# Altium schematic symbol library jlcpcb_2025_04_resistors_extended_1210.schlib: 2670 symbols (part 9 of 14) (continued)
## FRC1210F1201TS
designator R?  Resistance: 1.2kΩ  (hidden comment: *)
Resistor, 1.2kΩ, ±1%, 333.333mW, 200V, ±100ppm/℃, SMD 1210; Manufacturer: Uniroyal; Manufacturer Part Number: FRC1210F1201TS; Supplier 1: LCSC; Supplier Part Number 1: C3000653; JLCPCB Part Number: C3000653; Power Rating: 333.333mW; Category: Resistors; Package Size: 1210; JLCPCB Basic Part: Yes; Tolerance: ±1%; Voltage Rating: 200V; Temperature Coefficient: ±100ppm/℃; ComponentLink1Description: Datasheet; ComponentLink1URL: https://wmsc.lcsc.com/wmsc/upload/file/pdf/v2/lcsc/2308241947_FOJAN-FRC1210F1201TS_C3000653.pdf; ComponentLink2Description: JLCPCB Part URL; ComponentLink2URL: https://jlcpcb.com/partdetail/C3000653
pins: 1, 2
1 alternate drawing of the same symbol

## FRC1210F1301TS
designator R?  Resistance: 1.3kΩ  (hidden comment: *)
Resistor, 1.3kΩ, ±1%, 333.333mW, 200V, ±100ppm/℃, SMD 1210; Manufacturer: Uniroyal; Manufacturer Part Number: FRC1210F1301TS; Supplier 1: LCSC; Supplier Part Number 1: C3000753; JLCPCB Part Number: C3000753; Power Rating: 333.333mW; Category: Resistors; Package Size: 1210; JLCPCB Basic Part: Yes; Tolerance: ±1%; Voltage Rating: 200V; Temperature Coefficient: ±100ppm/℃; ComponentLink1Description: Datasheet; ComponentLink1URL: https://wmsc.lcsc.com/wmsc/upload/file/pdf/v2/lcsc/2308241947_FOJAN-FRC1210F1301TS_C3000753.pdf; ComponentLink2Description: JLCPCB Part URL; ComponentLink2URL: https://jlcpcb.com/partdetail/C3000753
pins: 1, 2
1 alternate drawing of the same symbol

## FRC1210F1400TS
designator R?  Resistance: 140Ω  (hidden comment: *)
Resistor, 140Ω, ±1%, 333.333mW, 200V, ±100ppm/℃, -55℃~+155℃, SMD 1210; Manufacturer: Uniroyal; Manufacturer Part Number: FRC1210F1400TS; Supplier 1: LCSC; Supplier Part Number 1: C2933804; JLCPCB Part Number: C2933804; Power Rating: 333.333mW; Category: Resistors; Package Size: 1210; JLCPCB Basic Part: Yes; Tolerance: ±1%; Voltage Rating: 200V; Temperature Coefficient: ±100ppm/℃; Temperature Rating: -55℃~+155℃; ComponentLink1Description: Datasheet; ComponentLink1URL: https://wmsc.lcsc.com/wmsc/upload/file/pdf/v2/lcsc/2308241115_FOJAN-FRC1210F1400TS_C2933804.pdf; ComponentLink2Description: JLCPCB Part URL; ComponentLink2URL: https://jlcpcb.com/partdetail/C2933804
pins: 1, 2
1 alternate drawing of the same symbol

## FRC1210F1500TS
designator R?  Resistance: 150Ω  (hidden comment: *)
Resistor, 150Ω, ±1%, 333.333mW, 200V, ±100ppm/℃, -55℃~+155℃, SMD 1210; Manufacturer: Uniroyal; Manufacturer Part Number: FRC1210F1500TS; Supplier 1: LCSC; Supplier Part Number 1: C2933805; JLCPCB Part Number: C2933805; Power Rating: 333.333mW; Category: Resistors; Package Size: 1210; JLCPCB Basic Part: Yes; Tolerance: ±1%; Voltage Rating: 200V; Temperature Coefficient: ±100ppm/℃; Temperature Rating: -55℃~+155℃; ComponentLink1Description: Datasheet; ComponentLink1URL: https://wmsc.lcsc.com/wmsc/upload/file/pdf/v2/lcsc/2308241115_FOJAN-FRC1210F1500TS_C2933805.pdf; ComponentLink2Description: JLCPCB Part URL; ComponentLink2URL: https://jlcpcb.com/partdetail/C2933805
pins: 1, 2
1 alternate drawing of the same symbol

## FRC1210F1501TS
designator R?  Resistance: 1.5kΩ  (hidden comment: *)
Resistor, 1.5kΩ, ±1%, 333.333mW, 200V, ±100ppm/℃, SMD 1210; Manufacturer: Uniroyal; Manufacturer Part Number: FRC1210F1501TS; Supplier 1: LCSC; Supplier Part Number 1: C2999566; JLCPCB Part Number: C2999566; Power Rating: 333.333mW; Category: Resistors; Package Size: 1210; JLCPCB Basic Part: Yes; Tolerance: ±1%; Voltage Rating: 200V; Temperature Coefficient: ±100ppm/℃; ComponentLink1Description: Datasheet; ComponentLink1URL: https://wmsc.lcsc.com/wmsc/upload/file/pdf/v2/lcsc/2308241947_FOJAN-FRC1210F1501TS_C2999566.pdf; ComponentLink2Description: JLCPCB Part URL; ComponentLink2URL: https://jlcpcb.com/partdetail/C2999566
pins: 1, 2
1 alternate drawing of the same symbol

## FRC1210F1502TS
designator R?  Resistance: 15kΩ  (hidden comment: *)
Resistor, 15kΩ, ±1%, SMD 1210; Manufacturer: Uniroyal; Manufacturer Part Number: FRC1210F1502TS; Supplier 1: LCSC; Supplier Part Number 1: C3013273; JLCPCB Part Number: C3013273; Category: Resistors; Package Size: 1210; JLCPCB Basic Part: Yes; Tolerance: ±1%; ComponentLink1Description: Datasheet; ComponentLink1URL: https://wmsc.lcsc.com/wmsc/upload/file/pdf/v2/lcsc/2308241947_FOJAN-FRC1210F1502TS_C3013273.pdf; ComponentLink2Description: JLCPCB Part URL; ComponentLink2URL: https://jlcpcb.com/partdetail/C3013273
pins: 1, 2
1 alternate drawing of the same symbol

## FRC1210F1602TS
designator R?  Resistance: 16kΩ  (hidden comment: *)
Resistor, 16kΩ, ±1%, 333.333mW, 200V, ±100ppm/℃, SMD 1210; Manufacturer: Uniroyal; Manufacturer Part Number: FRC1210F1602TS; Supplier 1: LCSC; Supplier Part Number 1: C3013274; JLCPCB Part Number: C3013274; Power Rating: 333.333mW; Category: Resistors; Package Size: 1210; JLCPCB Basic Part: Yes; Tolerance: ±1%; Voltage Rating: 200V; Temperature Coefficient: ±100ppm/℃; ComponentLink1Description: Datasheet; ComponentLink1URL: https://wmsc.lcsc.com/wmsc/upload/file/pdf/v2/lcsc/2308241947_FOJAN-FRC1210F1602TS_C3013274.pdf; ComponentLink2Description: JLCPCB Part URL; ComponentLink2URL: https://jlcpcb.com/partdetail/C3013274
pins: 1, 2
1 alternate drawing of the same symbol

## FRC1210F1800TS
designator R?  Resistance: 180Ω  (hidden comment: *)
Resistor, 180Ω, ±1%, 333.333mW, 200V, ±100ppm/℃, -55℃~+155℃, SMD 1210; Manufacturer: Uniroyal; Manufacturer Part Number: FRC1210F1800TS; Supplier 1: LCSC; Supplier Part Number 1: C2933806; JLCPCB Part Number: C2933806; Power Rating: 333.333mW; Category: Resistors; Package Size: 1210; JLCPCB Basic Part: Yes; Tolerance: ±1%; Voltage Rating: 200V; Temperature Coefficient: ±100ppm/℃; Temperature Rating: -55℃~+155℃; ComponentLink1Description: Datasheet; ComponentLink1URL: https://wmsc.lcsc.com/wmsc/upload/file/pdf/v2/lcsc/2308241115_FOJAN-FRC1210F1800TS_C2933806.pdf; ComponentLink2Description: JLCPCB Part URL; ComponentLink2URL: https://jlcpcb.com/partdetail/C2933806
pins: 1, 2
1 alternate drawing of the same symbol

## FRC1210F2003TS
designator R?  Resistance: 200kΩ  (hidden comment: *)
Resistor, 200kΩ, ±1%, 333.333mW, 200V, ±100ppm/℃, -55℃~+155℃, SMD 1210; Manufacturer: Uniroyal; Manufacturer Part Number: FRC1210F2003TS; Supplier 1: LCSC; Supplier Part Number 1: C2933812; JLCPCB Part Number: C2933812; Power Rating: 333.333mW; Category: Resistors; Package Size: 1210; JLCPCB Basic Part: Yes; Tolerance: ±1%; Voltage Rating: 200V; Temperature Coefficient: ±100ppm/℃; Temperature Rating: -55℃~+155℃; ComponentLink1Description: Datasheet; ComponentLink1URL: https://wmsc.lcsc.com/wmsc/upload/file/pdf/v2/lcsc/2308241115_FOJAN-FRC1210F2003TS_C2933812.pdf; ComponentLink2Description: JLCPCB Part URL; ComponentLink2URL: https://jlcpcb.com/partdetail/C2933812
pins: 1, 2
1 alternate drawing of the same symbol

## FRC1210F2200TS
designator R?  Resistance: 220Ω  (hidden comment: *)
Resistor, 220Ω, ±1%, 333.333mW, 200V, ±100ppm/℃, SMD 1210; Manufacturer: Uniroyal; Manufacturer Part Number: FRC1210F2200TS; Supplier 1: LCSC; Supplier Part Number 1: C3000591; JLCPCB Part Number: C3000591; Power Rating: 333.333mW; Category: Resistors; Package Size: 1210; JLCPCB Basic Part: Yes; Tolerance: ±1%; Voltage Rating: 200V; Temperature Coefficient: ±100ppm/℃; ComponentLink1Description: Datasheet; ComponentLink1URL: https://wmsc.lcsc.com/wmsc/upload/file/pdf/v2/lcsc/2308241947_FOJAN-FRC1210F2200TS_C3000591.pdf; ComponentLink2Description: JLCPCB Part URL; ComponentLink2URL: https://jlcpcb.com/partdetail/C3000591
pins: 1, 2
1 alternate drawing of the same symbol

## FRC1210F2201TS
designator R?  Resistance: 2.2kΩ  (hidden comment: *)
Resistor, 2.2kΩ, ±1%, 333.333mW, 200V, ±100ppm/℃, SMD 1210; Manufacturer: Uniroyal; Manufacturer Part Number: FRC1210F2201TS; Supplier 1: LCSC; Supplier Part Number 1: C3000590; JLCPCB Part Number: C3000590; Power Rating: 333.333mW; Category: Resistors; Package Size: 1210; JLCPCB Basic Part: Yes; Tolerance: ±1%; Voltage Rating: 200V; Temperature Coefficient: ±100ppm/℃; ComponentLink1Description: Datasheet; ComponentLink1URL: https://wmsc.lcsc.com/wmsc/upload/file/pdf/v2/lcsc/2308241947_FOJAN-FRC1210F2201TS_C3000590.pdf; ComponentLink2Description: JLCPCB Part URL; ComponentLink2URL: https://jlcpcb.com/partdetail/C3000590
pins: 1, 2
1 alternate drawing of the same symbol

## FRC1210F2202TS
designator R?  Resistance: 22kΩ  (hidden comment: *)
Resistor, 22kΩ, ±1%, 333.333mW, 200V, ±100ppm/℃, -55℃~+155℃, SMD 1210; Manufacturer: Uniroyal; Manufacturer Part Number: FRC1210F2202TS; Supplier 1: LCSC; Supplier Part Number 1: C2933814; JLCPCB Part Number: C2933814; Power Rating: 333.333mW; Category: Resistors; Package Size: 1210; JLCPCB Basic Part: Yes; Tolerance: ±1%; Voltage Rating: 200V; Temperature Coefficient: ±100ppm/℃; Temperature Rating: -55℃~+155℃; ComponentLink1Description: Datasheet; ComponentLink1URL: https://wmsc.lcsc.com/wmsc/upload/file/pdf/v2/lcsc/2308241115_FOJAN-FRC1210F2202TS_C2933814.pdf; ComponentLink2Description: JLCPCB Part URL; ComponentLink2URL: https://jlcpcb.com/partdetail/C2933814
pins: 1, 2
1 alternate drawing of the same symbol

## FRC1210F2490TS
designator R?  Resistance: 249Ω  (hidden comment: *)
Resistor, 249Ω, ±1%, 333.333mW, 200V, ±100ppm/℃, SMD 1210; Manufacturer: Uniroyal; Manufacturer Part Number: FRC1210F2490TS; Supplier 1: LCSC; Supplier Part Number 1: C3000542; JLCPCB Part Number: C3000542; Power Rating: 333.333mW; Category: Resistors; Package Size: 1210; JLCPCB Basic Part: Yes; Tolerance: ±1%; Voltage Rating: 200V; Temperature Coefficient: ±100ppm/℃; ComponentLink1Description: Datasheet; ComponentLink1URL: https://wmsc.lcsc.com/wmsc/upload/file/pdf/v2/lcsc/2308241947_FOJAN-FRC1210F2490TS_C3000542.pdf; ComponentLink2Description: JLCPCB Part URL; ComponentLink2URL: https://jlcpcb.com/partdetail/C3000542
pins: 1, 2
1 alternate drawing of the same symbol

## FRC1210F2700TS
designator R?  Resistance: 270Ω  (hidden comment: *)
Resistor, 270Ω, ±1%, 333.333mW, 200V, ±100ppm/℃, -55℃~+155℃, SMD 1210; Manufacturer: Uniroyal; Manufacturer Part Number: FRC1210F2700TS; Supplier 1: LCSC; Supplier Part Number 1: C2933816; JLCPCB Part Number: C2933816; Power Rating: 333.333mW; Category: Resistors; Package Size: 1210; JLCPCB Basic Part: Yes; Tolerance: ±1%; Voltage Rating: 200V; Temperature Coefficient: ±100ppm/℃; Temperature Rating: -55℃~+155℃; ComponentLink1Description: Datasheet; ComponentLink1URL: https://wmsc.lcsc.com/wmsc/upload/file/pdf/v2/lcsc/2308241115_FOJAN-FRC1210F2700TS_C2933816.pdf; ComponentLink2Description: JLCPCB Part URL; ComponentLink2URL: https://jlcpcb.com/partdetail/C2933816
pins: 1, 2
1 alternate drawing of the same symbol

## FRC1210F3000TS
designator R?  Resistance: 300Ω  (hidden comment: *)
Resistor, 300Ω, ±1%, 333.333mW, 200V, ±100ppm/℃, -55℃~+155℃, SMD 1210; Manufacturer: Uniroyal; Manufacturer Part Number: FRC1210F3000TS; Supplier 1: LCSC; Supplier Part Number 1: C2960903; JLCPCB Part Number: C2960903; Power Rating: 333.333mW; Category: Resistors; Package Size: 1210; JLCPCB Basic Part: Yes; Tolerance: ±1%; Voltage Rating: 200V; Temperature Coefficient: ±100ppm/℃; Temperature Rating: -55℃~+155℃; ComponentLink1Description: Datasheet; ComponentLink1URL: https://wmsc.lcsc.com/wmsc/upload/file/pdf/v2/lcsc/2308241947_FOJAN-FRC1210F3000TS_C2960903.pdf; ComponentLink2Description: JLCPCB Part URL; ComponentLink2URL: https://jlcpcb.com/partdetail/C2960903
pins: 1, 2
1 alternate drawing of the same symbol

## FRC1210F3300TS
designator R?  Resistance: 330Ω  (hidden comment: *)
Resistor, 330Ω, ±1%, 333.333mW, 200V, ±100ppm/℃, -55℃~+155℃, SMD 1210; Manufacturer: Uniroyal; Manufacturer Part Number: FRC1210F3300TS; Supplier 1: LCSC; Supplier Part Number 1: C2933817; JLCPCB Part Number: C2933817; Power Rating: 333.333mW; Category: Resistors; Package Size: 1210; JLCPCB Basic Part: Yes; Tolerance: ±1%; Voltage Rating: 200V; Temperature Coefficient: ±100ppm/℃; Temperature Rating: -55℃~+155℃; ComponentLink1Description: Datasheet; ComponentLink1URL: https://wmsc.lcsc.com/wmsc/upload/file/pdf/v2/lcsc/2308241115_FOJAN-FRC1210F3300TS_C2933817.pdf; ComponentLink2Description: JLCPCB Part URL; ComponentLink2URL: https://jlcpcb.com/partdetail/C2933817
pins: 1, 2
1 alternate drawing of the same symbol

## FRC1210F3301TS
designator R?  Resistance: 3.3kΩ  (hidden comment: *)
Resistor, 3.3kΩ, ±1%, 333.333mW, 200V, SMD 1210; Manufacturer: Uniroyal; Manufacturer Part Number: FRC1210F3301TS; Supplier 1: LCSC; Supplier Part Number 1: C2999567; JLCPCB Part Number: C2999567; Power Rating: 333.333mW; Category: Resistors; Package Size: 1210; JLCPCB Basic Part: Yes; Tolerance: ±1%; Voltage Rating: 200V; ComponentLink1Description: Datasheet; ComponentLink1URL: https://wmsc.lcsc.com/wmsc/upload/file/pdf/v2/lcsc/2308241947_FOJAN-FRC1210F3301TS_C2999567.pdf; ComponentLink2Description: JLCPCB Part URL; ComponentLink2URL: https://jlcpcb.com/partdetail/C2999567
pins: 1, 2
1 alternate drawing of the same symbol

## FRC1210F3302TS
designator R?  Resistance: 33kΩ  (hidden comment: *)
Resistor, 33kΩ, ±1%, 333.333mW, 200V, ±100ppm/℃, -55℃~+155℃, SMD 1210; Manufacturer: Uniroyal; Manufacturer Part Number: FRC1210F3302TS; Supplier 1: LCSC; Supplier Part Number 1: C2933818; JLCPCB Part Number: C2933818; Power Rating: 333.333mW; Category: Resistors; Package Size: 1210; JLCPCB Basic Part: Yes; Tolerance: ±1%; Voltage Rating: 200V; Temperature Coefficient: ±100ppm/℃; Temperature Rating: -55℃~+155℃; ComponentLink1Description: Datasheet; ComponentLink1URL: https://wmsc.lcsc.com/wmsc/upload/file/pdf/v2/lcsc/2308241115_FOJAN-FRC1210F3302TS_C2933818.pdf; ComponentLink2Description: JLCPCB Part URL; ComponentLink2URL: https://jlcpcb.com/partdetail/C2933818
pins: 1, 2
1 alternate drawing of the same symbol

## FRC1210F3570TS
designator R?  Resistance: 357Ω  (hidden comment: *)
Resistor, 357Ω, ±1%, 333.333mW, 200V, ±100ppm/℃, SMD 1210; Manufacturer: Uniroyal; Manufacturer Part Number: FRC1210F3570TS; Supplier 1: LCSC; Supplier Part Number 1: C5713338; JLCPCB Part Number: C5713338; Power Rating: 333.333mW; Category: Resistors; Package Size: 1210; JLCPCB Basic Part: Yes; Tolerance: ±1%; Voltage Rating: 200V; Temperature Coefficient: ±100ppm/℃; ComponentLink1Description: Datasheet; ComponentLink1URL: https://wmsc.lcsc.com/wmsc/upload/file/pdf/v2/lcsc/2308241947_FOJAN-FRC1210F3570TS_C5713338.pdf; ComponentLink2Description: JLCPCB Part URL; ComponentLink2URL: https://jlcpcb.com/partdetail/C5713338
pins: 1, 2
1 alternate drawing of the same symbol

## FRC1210F4700TS
designator R?  Resistance: 470Ω  (hidden comment: *)
Resistor, 470Ω, ±1%, 333.333mW, 200V, ±100ppm/℃, SMD 1210; Manufacturer: Uniroyal; Manufacturer Part Number: FRC1210F4700TS; Supplier 1: LCSC; Supplier Part Number 1: C3013280; JLCPCB Part Number: C3013280; Power Rating: 333.333mW; Category: Resistors; Package Size: 1210; JLCPCB Basic Part: Yes; Tolerance: ±1%; Voltage Rating: 200V; Temperature Coefficient: ±100ppm/℃; ComponentLink1Description: Datasheet; ComponentLink1URL: https://wmsc.lcsc.com/wmsc/upload/file/pdf/v2/lcsc/2308241947_FOJAN-FRC1210F4700TS_C3013280.pdf; ComponentLink2Description: JLCPCB Part URL; ComponentLink2URL: https://jlcpcb.com/partdetail/C3013280
pins: 1, 2
1 alternate drawing of the same symbol

## FRC1210F4701TS
designator R?  Resistance: 4.7kΩ  (hidden comment: *)
Resistor, 4.7kΩ, ±1%, 333.333mW, 200V, ±100ppm/℃, -55℃~+155℃, SMD 1210; Manufacturer: Uniroyal; Manufacturer Part Number: FRC1210F4701TS; Supplier 1: LCSC; Supplier Part Number 1: C2930443; JLCPCB Part Number: C2930443; Power Rating: 333.333mW; Category: Resistors; Package Size: 1210; JLCPCB Basic Part: Yes; Tolerance: ±1%; Voltage Rating: 200V; Temperature Coefficient: ±100ppm/℃; Temperature Rating: -55℃~+155℃; ComponentLink1Description: Datasheet; ComponentLink1URL: https://wmsc.lcsc.com/wmsc/upload/file/pdf/v2/lcsc/2308241947_FOJAN-FRC1210F4701TS_C2930443.pdf; ComponentLink2Description: JLCPCB Part URL; ComponentLink2URL: https://jlcpcb.com/partdetail/C2930443
pins: 1, 2
1 alternate drawing of the same symbol

## FRC1210F4703TS
designator R?  Resistance: 470kΩ  (hidden comment: *)
Resistor, 470kΩ, ±1%, 333.333mW, 200V, ±100ppm/℃, SMD 1210; Manufacturer: Uniroyal; Manufacturer Part Number: FRC1210F4703TS; Supplier 1: LCSC; Supplier Part Number 1: C3000657; JLCPCB Part Number: C3000657; Power Rating: 333.333mW; Category: Resistors; Package Size: 1210; JLCPCB Basic Part: Yes; Tolerance: ±1%; Voltage Rating: 200V; Temperature Coefficient: ±100ppm/℃; ComponentLink1Description: Datasheet; ComponentLink1URL: https://wmsc.lcsc.com/wmsc/upload/file/pdf/v2/lcsc/2308241947_FOJAN-FRC1210F4703TS_C3000657.pdf; ComponentLink2Description: JLCPCB Part URL; ComponentLink2URL: https://jlcpcb.com/partdetail/C3000657
pins: 1, 2
1 alternate drawing of the same symbol

## FRC1210F4992TS
designator R?  Resistance: 49.9kΩ  (hidden comment: *)
Resistor, 49.9kΩ, ±1%, 333.333mW, 200V, ±100ppm/℃, -55℃~+155℃, SMD 1210; Manufacturer: Uniroyal; Manufacturer Part Number: FRC1210F4992TS; Supplier 1: LCSC; Supplier Part Number 1: C2933821; JLCPCB Part Number: C2933821; Power Rating: 333.333mW; Category: Resistors; Package Size: 1210; JLCPCB Basic Part: Yes; Tolerance: ±1%; Voltage Rating: 200V; Temperature Coefficient: ±100ppm/℃; Temperature Rating: -55℃~+155℃; ComponentLink1Description: Datasheet; ComponentLink1URL: https://wmsc.lcsc.com/wmsc/upload/file/pdf/v2/lcsc/2308241115_FOJAN-FRC1210F4992TS_C2933821.pdf; ComponentLink2Description: JLCPCB Part URL; ComponentLink2URL: https://jlcpcb.com/partdetail/C2933821
pins: 1, 2
1 alternate drawing of the same symbol

## FRC1210F4993TS
designator R?  Resistance: 499kΩ  (hidden comment: *)
Resistor, 499kΩ, ±1%, 333.333mW, 200V, ±100ppm/℃, SMD 1210; Manufacturer: Uniroyal; Manufacturer Part Number: FRC1210F4993TS; Supplier 1: LCSC; Supplier Part Number 1: C3000756; JLCPCB Part Number: C3000756; Power Rating: 333.333mW; Category: Resistors; Package Size: 1210; JLCPCB Basic Part: Yes; Tolerance: ±1%; Voltage Rating: 200V; Temperature Coefficient: ±100ppm/℃; ComponentLink1Description: Datasheet; ComponentLink1URL: https://wmsc.lcsc.com/wmsc/upload/file/pdf/v2/lcsc/2308241947_FOJAN-FRC1210F4993TS_C3000756.pdf; ComponentLink2Description: JLCPCB Part URL; ComponentLink2URL: https://jlcpcb.com/partdetail/C3000756
pins: 1, 2
1 alternate drawing of the same symbol

## FRC1210F5100TS
designator R?  Resistance: 510Ω  (hidden comment: *)
Resistor, 510Ω, ±1%, 333.333mW, 200V, ±100ppm/℃, SMD 1210; Manufacturer: Uniroyal; Manufacturer Part Number: FRC1210F5100TS; Supplier 1: LCSC; Supplier Part Number 1: C2999574; JLCPCB Part Number: C2999574; Power Rating: 333.333mW; Category: Resistors; Package Size: 1210; JLCPCB Basic Part: Yes; Tolerance: ±1%; Voltage Rating: 200V; Temperature Coefficient: ±100ppm/℃; ComponentLink1Description: Datasheet; ComponentLink1URL: https://wmsc.lcsc.com/wmsc/upload/file/pdf/v2/lcsc/2308241947_FOJAN-FRC1210F5100TS_C2999574.pdf; ComponentLink2Description: JLCPCB Part URL; ComponentLink2URL: https://jlcpcb.com/partdetail/C2999574
pins: 1, 2
1 alternate drawing of the same symbol

## FRC1210F5101TS
designator R?  Resistance: 5.1kΩ  (hidden comment: *)
Resistor, 5.1kΩ, ±1%, 333.333mW, 200V, ±100ppm/℃, -55℃~+155℃, SMD 1210; Manufacturer: Uniroyal; Manufacturer Part Number: FRC1210F5101TS; Supplier 1: LCSC; Supplier Part Number 1: C2933822; JLCPCB Part Number: C2933822; Power Rating: 333.333mW; Category: Resistors; Package Size: 1210; JLCPCB Basic Part: Yes; Tolerance: ±1%; Voltage Rating: 200V; Temperature Coefficient: ±100ppm/℃; Temperature Rating: -55℃~+155℃; ComponentLink1Description: Datasheet; ComponentLink1URL: https://wmsc.lcsc.com/wmsc/upload/file/pdf/v2/lcsc/2308241115_FOJAN-FRC1210F5101TS_C2933822.pdf; ComponentLink2Description: JLCPCB Part URL; ComponentLink2URL: https://jlcpcb.com/partdetail/C2933822
pins: 1, 2
1 alternate drawing of the same symbol

## FRC1210F5103TS
designator R?  Resistance: 510kΩ  (hidden comment: *)
Resistor, 510kΩ, ±1%, 333.333mW, 200V, ±100ppm/℃, SMD 1210; Manufacturer: Uniroyal; Manufacturer Part Number: FRC1210F5103TS; Supplier 1: LCSC; Supplier Part Number 1: C3000757; JLCPCB Part Number: C3000757; Power Rating: 333.333mW; Category: Resistors; Package Size: 1210; JLCPCB Basic Part: Yes; Tolerance: ±1%; Voltage Rating: 200V; Temperature Coefficient: ±100ppm/℃; ComponentLink1Description: Datasheet; ComponentLink1URL: https://wmsc.lcsc.com/wmsc/upload/file/pdf/v2/lcsc/2308241947_FOJAN-FRC1210F5103TS_C3000757.pdf; ComponentLink2Description: JLCPCB Part URL; ComponentLink2URL: https://jlcpcb.com/partdetail/C3000757
pins: 1, 2
1 alternate drawing of the same symbol

## FRC1210F5601TS
designator R?  Resistance: 5.6kΩ  (hidden comment: *)
Resistor, 5.6kΩ, ±1%, 333.333mW, 200V, ±100ppm/℃, SMD 1210; Manufacturer: Uniroyal; Manufacturer Part Number: FRC1210F5601TS; Supplier 1: LCSC; Supplier Part Number 1: C3000658; JLCPCB Part Number: C3000658; Power Rating: 333.333mW; Category: Resistors; Package Size: 1210; JLCPCB Basic Part: Yes; Tolerance: ±1%; Voltage Rating: 200V; Temperature Coefficient: ±100ppm/℃; ComponentLink1Description: Datasheet; ComponentLink1URL: https://wmsc.lcsc.com/wmsc/upload/file/pdf/v2/lcsc/2308241947_FOJAN-FRC1210F5601TS_C3000658.pdf; ComponentLink2Description: JLCPCB Part URL; ComponentLink2URL: https://jlcpcb.com/partdetail/C3000658
pins: 1, 2
1 alternate drawing of the same symbol

## FRC1210F6200TS
designator R?  Resistance: 620Ω  (hidden comment: *)
Resistor, 620Ω, ±1%, 333.333mW, 200V, ±100ppm/℃, SMD 1210; Manufacturer: Uniroyal; Manufacturer Part Number: FRC1210F6200TS; Supplier 1: LCSC; Supplier Part Number 1: C3000545; JLCPCB Part Number: C3000545; Power Rating: 333.333mW; Category: Resistors; Package Size: 1210; JLCPCB Basic Part: Yes; Tolerance: ±1%; Voltage Rating: 200V; Temperature Coefficient: ±100ppm/℃; ComponentLink1Description: Datasheet; ComponentLink1URL: https://wmsc.lcsc.com/wmsc/upload/file/pdf/v2/lcsc/2308241947_FOJAN-FRC1210F6200TS_C3000545.pdf; ComponentLink2Description: JLCPCB Part URL; ComponentLink2URL: https://jlcpcb.com/partdetail/C3000545
pins: 1, 2
1 alternate drawing of the same symbol

## FRC1210F6201TS
designator R?  Resistance: 6.2kΩ  (hidden comment: *)
Resistor, 6.2kΩ, ±1%, 333.333mW, 200V, ±100ppm/℃, -55℃~+155℃, SMD 1210; Manufacturer: Uniroyal; Manufacturer Part Number: FRC1210F6201TS; Supplier 1: LCSC; Supplier Part Number 1: C2933824; JLCPCB Part Number: C2933824; Power Rating: 333.333mW; Category: Resistors; Package Size: 1210; JLCPCB Basic Part: Yes; Tolerance: ±1%; Voltage Rating: 200V; Temperature Coefficient: ±100ppm/℃; Temperature Rating: -55℃~+155℃; ComponentLink1Description: Datasheet; ComponentLink1URL: https://wmsc.lcsc.com/wmsc/upload/file/pdf/v2/lcsc/2308241115_FOJAN-FRC1210F6201TS_C2933824.pdf; ComponentLink2Description: JLCPCB Part URL; ComponentLink2URL: https://jlcpcb.com/partdetail/C2933824
pins: 1, 2
1 alternate drawing of the same symbol

## FRC1210F8200TS
designator R?  Resistance: 820Ω  (hidden comment: *)
Resistor, 820Ω, ±1%, 333.333mW, 200V, ±100ppm/℃, SMD 1210; Manufacturer: Uniroyal; Manufacturer Part Number: FRC1210F8200TS; Supplier 1: LCSC; Supplier Part Number 1: C3013285; JLCPCB Part Number: C3013285; Power Rating: 333.333mW; Category: Resistors; Package Size: 1210; JLCPCB Basic Part: Yes; Tolerance: ±1%; Voltage Rating: 200V; Temperature Coefficient: ±100ppm/℃; ComponentLink1Description: Datasheet; ComponentLink1URL: https://wmsc.lcsc.com/wmsc/upload/file/pdf/v2/lcsc/2308241947_FOJAN-FRC1210F8200TS_C3013285.pdf; ComponentLink2Description: JLCPCB Part URL; ComponentLink2URL: https://jlcpcb.com/partdetail/C3013285
pins: 1, 2
1 alternate drawing of the same symbol

## FRC1210J1R0 TS
designator R?  Resistance: 1Ω  (hidden comment: *)
Resistor, 1Ω, ±5%, 333.333mW, 200V, ±200ppm/℃, -55℃~+155℃, SMD 1210; Manufacturer: Uniroyal; Manufacturer Part Number: FRC1210J1R0 TS; Supplier 1: LCSC; Supplier Part Number 1: C2974068; JLCPCB Part Number: C2974068; Power Rating: 333.333mW; Category: Resistors; Package Size: 1210; JLCPCB Basic Part: Yes; Tolerance: ±5%; Voltage Rating: 200V; Temperature Coefficient: ±200ppm/℃; Temperature Rating: -55℃~+155℃; ComponentLink1Description: Datasheet; ComponentLink1URL: https://wmsc.lcsc.com/wmsc/upload/file/pdf/v2/lcsc/2202151130_FOJAN-FRC1210J1R0-TS_C2974068.pdf; ComponentLink2Description: JLCPCB Part URL; ComponentLink2URL: https://jlcpcb.com/partdetail/C2974068
pins: 1, 2
1 alternate drawing of the same symbol

## FRC1210J1R1 TS
designator R?  Resistance: 1.1Ω  (hidden comment: *)
Resistor, 1.1Ω, ±5%, 333.333mW, 200V, ±200ppm/℃, -55℃~+155℃, SMD 1210; Manufacturer: Uniroyal; Manufacturer Part Number: FRC1210J1R1 TS; Supplier 1: LCSC; Supplier Part Number 1: C2933840; JLCPCB Part Number: C2933840; Power Rating: 333.333mW; Category: Resistors; Package Size: 1210; JLCPCB Basic Part: Yes; Tolerance: ±5%; Voltage Rating: 200V; Temperature Coefficient: ±200ppm/℃; Temperature Rating: -55℃~+155℃; ComponentLink1Description: Datasheet; ComponentLink1URL: https://wmsc.lcsc.com/wmsc/upload/file/pdf/v2/lcsc/2308241115_FOJAN-FRC1210J1R1-TS_C2933840.pdf; ComponentLink2Description: JLCPCB Part URL; ComponentLink2URL: https://jlcpcb.com/partdetail/C2933840
pins: 1, 2
1 alternate drawing of the same symbol

## FRC1210J1R2TS
designator R?  Resistance: 1.2Ω  (hidden comment: *)
Resistor, 1.2Ω, ±5%, 333.333mW, 200V, ±200ppm/℃, SMD 1210; Manufacturer: Uniroyal; Manufacturer Part Number: FRC1210J1R2TS; Supplier 1: LCSC; Supplier Part Number 1: C3000630; JLCPCB Part Number: C3000630; Power Rating: 333.333mW; Category: Resistors; Package Size: 1210; JLCPCB Basic Part: Yes; Tolerance: ±5%; Voltage Rating: 200V; Temperature Coefficient: ±200ppm/℃; ComponentLink1Description: Datasheet; ComponentLink1URL: https://wmsc.lcsc.com/wmsc/upload/file/pdf/v2/lcsc/2308241947_FOJAN-FRC1210J1R2TS_C3000630.pdf; ComponentLink2Description: JLCPCB Part URL; ComponentLink2URL: https://jlcpcb.com/partdetail/C3000630
pins: 1, 2
1 alternate drawing of the same symbol

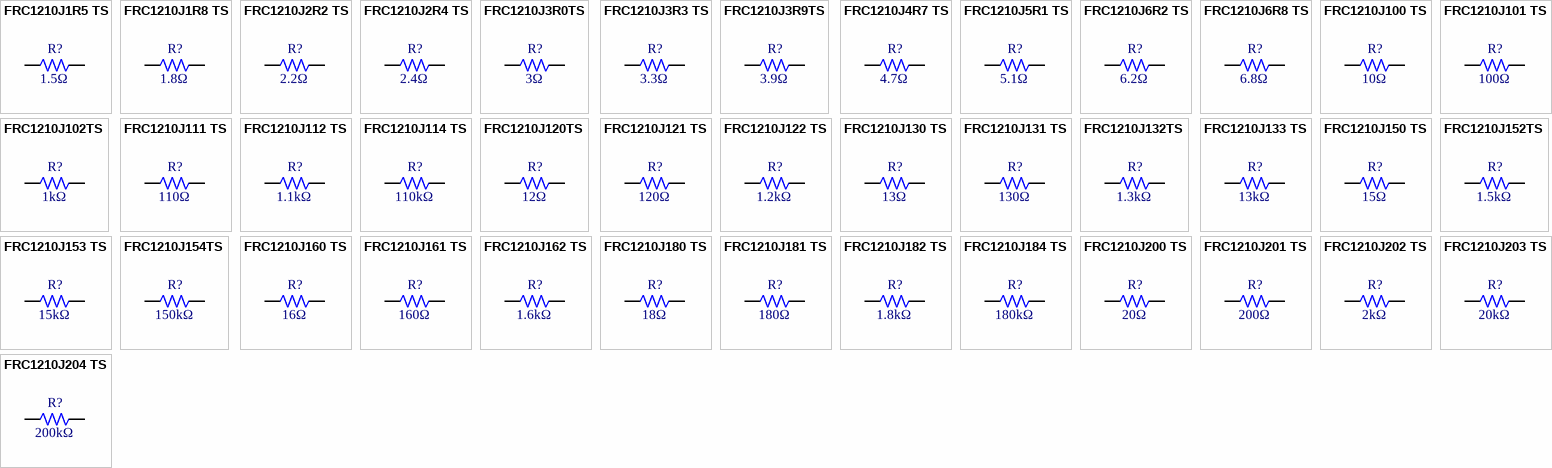
[diagram p42: symbols FRC1210J1R5 TS to FRC1210J204 TS]

## FRC1210J1R5 TS
designator R?  Resistance: 1.5Ω  (hidden comment: *)
Resistor, 1.5Ω, ±5%, 333.333mW, 200V, ±200ppm/℃, -55℃~+155℃, SMD 1210; Manufacturer: Uniroyal; Manufacturer Part Number: FRC1210J1R5 TS; Supplier 1: LCSC; Supplier Part Number 1: C2960666; JLCPCB Part Number: C2960666; Power Rating: 333.333mW; Category: Resistors; Package Size: 1210; JLCPCB Basic Part: Yes; Tolerance: ±5%; Voltage Rating: 200V; Temperature Coefficient: ±200ppm/℃; Temperature Rating: -55℃~+155℃; ComponentLink1Description: Datasheet; ComponentLink1URL: https://wmsc.lcsc.com/wmsc/upload/file/pdf/v2/lcsc/2308241947_FOJAN-FRC1210J1R5-TS_C2960666.pdf; ComponentLink2Description: JLCPCB Part URL; ComponentLink2URL: https://jlcpcb.com/partdetail/C2960666
pins: 1, 2
1 alternate drawing of the same symbol

## FRC1210J1R8 TS
designator R?  Resistance: 1.8Ω  (hidden comment: *)
Resistor, 1.8Ω, ±5%, 333.333mW, 200V, ±200ppm/℃, -55℃~+155℃, SMD 1210; Manufacturer: Uniroyal; Manufacturer Part Number: FRC1210J1R8 TS; Supplier 1: LCSC; Supplier Part Number 1: C2960864; JLCPCB Part Number: C2960864; Power Rating: 333.333mW; Category: Resistors; Package Size: 1210; JLCPCB Basic Part: Yes; Tolerance: ±5%; Voltage Rating: 200V; Temperature Coefficient: ±200ppm/℃; Temperature Rating: -55℃~+155℃; ComponentLink1Description: Datasheet; ComponentLink1URL: https://wmsc.lcsc.com/wmsc/upload/file/pdf/v2/lcsc/2308241947_FOJAN-FRC1210J1R8-TS_C2960864.pdf; ComponentLink2Description: JLCPCB Part URL; ComponentLink2URL: https://jlcpcb.com/partdetail/C2960864
pins: 1, 2
1 alternate drawing of the same symbol

## FRC1210J2R2 TS
designator R?  Resistance: 2.2Ω  (hidden comment: *)
Resistor, 2.2Ω, ±5%, 333.333mW, 200V, ±200ppm/℃, -55℃~+155℃, SMD 1210; Manufacturer: Uniroyal; Manufacturer Part Number: FRC1210J2R2 TS; Supplier 1: LCSC; Supplier Part Number 1: C2907545; JLCPCB Part Number: C2907545; Power Rating: 333.333mW; Category: Resistors; Package Size: 1210; JLCPCB Basic Part: Yes; Tolerance: ±5%; Voltage Rating: 200V; Temperature Coefficient: ±200ppm/℃; Temperature Rating: -55℃~+155℃; ComponentLink1Description: Datasheet; ComponentLink1URL: https://wmsc.lcsc.com/wmsc/upload/file/pdf/v2/lcsc/2308241947_FOJAN-FRC1210J2R2-TS_C2907545.pdf; ComponentLink2Description: JLCPCB Part URL; ComponentLink2URL: https://jlcpcb.com/partdetail/C2907545
pins: 1, 2
1 alternate drawing of the same symbol

## FRC1210J2R4 TS
designator R?  Resistance: 2.4Ω  (hidden comment: *)
Resistor, 2.4Ω, ±5%, 333.333mW, 200V, ±200ppm/℃, -55℃~+155℃, SMD 1210; Manufacturer: Uniroyal; Manufacturer Part Number: FRC1210J2R4 TS; Supplier 1: LCSC; Supplier Part Number 1: C2933857; JLCPCB Part Number: C2933857; Power Rating: 333.333mW; Category: Resistors; Package Size: 1210; JLCPCB Basic Part: Yes; Tolerance: ±5%; Voltage Rating: 200V; Temperature Coefficient: ±200ppm/℃; Temperature Rating: -55℃~+155℃; ComponentLink1Description: Datasheet; ComponentLink1URL: https://wmsc.lcsc.com/wmsc/upload/file/pdf/v2/lcsc/2308241115_FOJAN-FRC1210J2R4-TS_C2933857.pdf; ComponentLink2Description: JLCPCB Part URL; ComponentLink2URL: https://jlcpcb.com/partdetail/C2933857
pins: 1, 2
1 alternate drawing of the same symbol

## FRC1210J3R0TS
designator R?  Resistance: 3Ω  (hidden comment: *)
Resistor, 3Ω, ±5%, 333.333mW, 200V, ±200ppm/℃, -55℃~+155℃, SMD 1210; Manufacturer: Uniroyal; Manufacturer Part Number: FRC1210J3R0TS; Supplier 1: LCSC; Supplier Part Number 1: C2930442; JLCPCB Part Number: C2930442; Power Rating: 333.333mW; Category: Resistors; Package Size: 1210; JLCPCB Basic Part: Yes; Tolerance: ±5%; Voltage Rating: 200V; Temperature Coefficient: ±200ppm/℃; Temperature Rating: -55℃~+155℃; ComponentLink1Description: Datasheet; ComponentLink1URL: https://wmsc.lcsc.com/wmsc/upload/file/pdf/v2/lcsc/2308241947_FOJAN-FRC1210J3R0TS_C2930442.pdf; ComponentLink2Description: JLCPCB Part URL; ComponentLink2URL: https://jlcpcb.com/partdetail/C2930442
pins: 1, 2
1 alternate drawing of the same symbol

## FRC1210J3R3 TS
designator R?  Resistance: 3.3Ω  (hidden comment: *)
Resistor, 3.3Ω, ±5%, 333.333mW, 200V, ±200ppm/℃, -55℃~+155℃, SMD 1210; Manufacturer: Uniroyal; Manufacturer Part Number: FRC1210J3R3 TS; Supplier 1: LCSC; Supplier Part Number 1: C2933865; JLCPCB Part Number: C2933865; Power Rating: 333.333mW; Category: Resistors; Package Size: 1210; JLCPCB Basic Part: Yes; Tolerance: ±5%; Voltage Rating: 200V; Temperature Coefficient: ±200ppm/℃; Temperature Rating: -55℃~+155℃; ComponentLink1Description: Datasheet; ComponentLink1URL: https://wmsc.lcsc.com/wmsc/upload/file/pdf/v2/lcsc/2308241115_FOJAN-FRC1210J3R3-TS_C2933865.pdf; ComponentLink2Description: JLCPCB Part URL; ComponentLink2URL: https://jlcpcb.com/partdetail/C2933865
pins: 1, 2
1 alternate drawing of the same symbol

## FRC1210J3R9TS
designator R?  Resistance: 3.9Ω  (hidden comment: *)
Resistor, 3.9Ω, ±5%, 333.333mW, 200V, SMD 1210; Manufacturer: Uniroyal; Manufacturer Part Number: FRC1210J3R9TS; Supplier 1: LCSC; Supplier Part Number 1: C3000690; JLCPCB Part Number: C3000690; Power Rating: 333.333mW; Category: Resistors; Package Size: 1210; JLCPCB Basic Part: Yes; Tolerance: ±5%; Voltage Rating: 200V; ComponentLink1Description: Datasheet; ComponentLink1URL: https://wmsc.lcsc.com/wmsc/upload/file/pdf/v2/lcsc/2308241947_FOJAN-FRC1210J3R9TS_C3000690.pdf; ComponentLink2Description: JLCPCB Part URL; ComponentLink2URL: https://jlcpcb.com/partdetail/C3000690
pins: 1, 2
1 alternate drawing of the same symbol

## FRC1210J4R7 TS
designator R?  Resistance: 4.7Ω  (hidden comment: *)
Resistor, 4.7Ω, ±5%, 333.333mW, 200V, ±200ppm/℃, -55℃~+155℃, SMD 1210; Manufacturer: Uniroyal; Manufacturer Part Number: FRC1210J4R7 TS; Supplier 1: LCSC; Supplier Part Number 1: C2960784; JLCPCB Part Number: C2960784; Power Rating: 333.333mW; Category: Resistors; Package Size: 1210; JLCPCB Basic Part: Yes; Tolerance: ±5%; Voltage Rating: 200V; Temperature Coefficient: ±200ppm/℃; Temperature Rating: -55℃~+155℃; ComponentLink1Description: Datasheet; ComponentLink1URL: https://wmsc.lcsc.com/wmsc/upload/file/pdf/v2/lcsc/2308241947_FOJAN-FRC1210J4R7-TS_C2960784.pdf; ComponentLink2Description: JLCPCB Part URL; ComponentLink2URL: https://jlcpcb.com/partdetail/C2960784
pins: 1, 2
1 alternate drawing of the same symbol

## FRC1210J5R1 TS
designator R?  Resistance: 5.1Ω  (hidden comment: *)
Resistor, 5.1Ω, ±5%, 333.333mW, 200V, ±200ppm/℃, -55℃~+155℃, SMD 1210; Manufacturer: Uniroyal; Manufacturer Part Number: FRC1210J5R1 TS; Supplier 1: LCSC; Supplier Part Number 1: C2933870; JLCPCB Part Number: C2933870; Power Rating: 333.333mW; Category: Resistors; Package Size: 1210; JLCPCB Basic Part: Yes; Tolerance: ±5%; Voltage Rating: 200V; Temperature Coefficient: ±200ppm/℃; Temperature Rating: -55℃~+155℃; ComponentLink1Description: Datasheet; ComponentLink1URL: https://wmsc.lcsc.com/wmsc/upload/file/pdf/v2/lcsc/2308241115_FOJAN-FRC1210J5R1-TS_C2933870.pdf; ComponentLink2Description: JLCPCB Part URL; ComponentLink2URL: https://jlcpcb.com/partdetail/C2933870
pins: 1, 2
1 alternate drawing of the same symbol

## FRC1210J6R2 TS
designator R?  Resistance: 6.2Ω  (hidden comment: *)
Resistor, 6.2Ω, ±5%, 333.333mW, 200V, ±200ppm/℃, -55℃~+155℃, SMD 1210; Manufacturer: Uniroyal; Manufacturer Part Number: FRC1210J6R2 TS; Supplier 1: LCSC; Supplier Part Number 1: C2960742; JLCPCB Part Number: C2960742; Power Rating: 333.333mW; Category: Resistors; Package Size: 1210; JLCPCB Basic Part: Yes; Tolerance: ±5%; Voltage Rating: 200V; Temperature Coefficient: ±200ppm/℃; Temperature Rating: -55℃~+155℃; ComponentLink1Description: Datasheet; ComponentLink1URL: https://wmsc.lcsc.com/wmsc/upload/file/pdf/v2/lcsc/2308241947_FOJAN-FRC1210J6R2-TS_C2960742.pdf; ComponentLink2Description: JLCPCB Part URL; ComponentLink2URL: https://jlcpcb.com/partdetail/C2960742
pins: 1, 2
1 alternate drawing of the same symbol

## FRC1210J6R8 TS
designator R?  Resistance: 6.8Ω  (hidden comment: *)
Resistor, 6.8Ω, ±5%, 333.333mW, 200V, ±200ppm/℃, -55℃~+155℃, SMD 1210; Manufacturer: Uniroyal; Manufacturer Part Number: FRC1210J6R8 TS; Supplier 1: LCSC; Supplier Part Number 1: C2933873; JLCPCB Part Number: C2933873; Power Rating: 333.333mW; Category: Resistors; Package Size: 1210; JLCPCB Basic Part: Yes; Tolerance: ±5%; Voltage Rating: 200V; Temperature Coefficient: ±200ppm/℃; Temperature Rating: -55℃~+155℃; ComponentLink1Description: Datasheet; ComponentLink1URL: https://wmsc.lcsc.com/wmsc/upload/file/pdf/v2/lcsc/2308241115_FOJAN-FRC1210J6R8-TS_C2933873.pdf; ComponentLink2Description: JLCPCB Part URL; ComponentLink2URL: https://jlcpcb.com/partdetail/C2933873
pins: 1, 2
1 alternate drawing of the same symbol

## FRC1210J100 TS
designator R?  Resistance: 10Ω  (hidden comment: *)
Resistor, 10Ω, ±5%, 333.333mW, 200V, ±100ppm/℃, -55℃~+155℃, SMD 1210; Manufacturer: Uniroyal; Manufacturer Part Number: FRC1210J100 TS; Supplier 1: LCSC; Supplier Part Number 1: C2907544; JLCPCB Part Number: C2907544; Power Rating: 333.333mW; Category: Resistors; Package Size: 1210; JLCPCB Basic Part: Yes; Tolerance: ±5%; Voltage Rating: 200V; Temperature Coefficient: ±100ppm/℃; Temperature Rating: -55℃~+155℃; ComponentLink1Description: Datasheet; ComponentLink1URL: https://wmsc.lcsc.com/wmsc/upload/file/pdf/v2/lcsc/2308241947_FOJAN-FRC1210J100-TS_C2907544.pdf; ComponentLink2Description: JLCPCB Part URL; ComponentLink2URL: https://jlcpcb.com/partdetail/C2907544
pins: 1, 2
1 alternate drawing of the same symbol

## FRC1210J101 TS
designator R?  Resistance: 100Ω  (hidden comment: *)
Resistor, 100Ω, ±5%, 500mW, 200V, ±100ppm/℃, -55℃~+155℃, SMD 1210; Manufacturer: Uniroyal; Manufacturer Part Number: FRC1210J101 TS; Supplier 1: LCSC; Supplier Part Number 1: C2933827; JLCPCB Part Number: C2933827; Power Rating: 500mW; Category: Resistors; Package Size: 1210; JLCPCB Basic Part: Yes; Tolerance: ±5%; Voltage Rating: 200V; Temperature Coefficient: ±100ppm/℃; Temperature Rating: -55℃~+155℃; ComponentLink1Description: Datasheet; ComponentLink1URL: https://wmsc.lcsc.com/wmsc/upload/file/pdf/v2/lcsc/2308241115_FOJAN-FRC1210J101-TS_C2933827.pdf; ComponentLink2Description: JLCPCB Part URL; ComponentLink2URL: https://jlcpcb.com/partdetail/C2933827
pins: 1, 2
1 alternate drawing of the same symbol

## FRC1210J102TS
designator R?  Resistance: 1kΩ  (hidden comment: *)
Resistor, 1kΩ, ±5%, 333.333mW, 200V, ±100ppm/℃, -55℃~+155℃, SMD 1210; Manufacturer: Uniroyal; Manufacturer Part Number: FRC1210J102TS; Supplier 1: LCSC; Supplier Part Number 1: C2930439; JLCPCB Part Number: C2930439; Power Rating: 333.333mW; Category: Resistors; Package Size: 1210; JLCPCB Basic Part: Yes; Tolerance: ±5%; Voltage Rating: 200V; Temperature Coefficient: ±100ppm/℃; Temperature Rating: -55℃~+155℃; ComponentLink1Description: Datasheet; ComponentLink1URL: https://wmsc.lcsc.com/wmsc/upload/file/pdf/v2/lcsc/2308241947_FOJAN-FRC1210J102TS_C2930439.pdf; ComponentLink2Description: JLCPCB Part URL; ComponentLink2URL: https://jlcpcb.com/partdetail/C2930439
pins: 1, 2
1 alternate drawing of the same symbol

## FRC1210J111 TS
designator R?  Resistance: 110Ω  (hidden comment: *)
Resistor, 110Ω, ±5%, 333.333mW, 200V, ±100ppm/℃, -55℃~+155℃, SMD 1210; Manufacturer: Uniroyal; Manufacturer Part Number: FRC1210J111 TS; Supplier 1: LCSC; Supplier Part Number 1: C2933830; JLCPCB Part Number: C2933830; Power Rating: 333.333mW; Category: Resistors; Package Size: 1210; JLCPCB Basic Part: Yes; Tolerance: ±5%; Voltage Rating: 200V; Temperature Coefficient: ±100ppm/℃; Temperature Rating: -55℃~+155℃; ComponentLink1Description: Datasheet; ComponentLink1URL: https://wmsc.lcsc.com/wmsc/upload/file/pdf/v2/lcsc/2308241115_FOJAN-FRC1210J111-TS_C2933830.pdf; ComponentLink2Description: JLCPCB Part URL; ComponentLink2URL: https://jlcpcb.com/partdetail/C2933830
pins: 1, 2
1 alternate drawing of the same symbol

## FRC1210J112 TS
designator R?  Resistance: 1.1kΩ  (hidden comment: *)
Resistor, 1.1kΩ, ±5%, 333.333mW, 200V, ±100ppm/℃, -55℃~+155℃, SMD 1210; Manufacturer: Uniroyal; Manufacturer Part Number: FRC1210J112 TS; Supplier 1: LCSC; Supplier Part Number 1: C2933831; JLCPCB Part Number: C2933831; Power Rating: 333.333mW; Category: Resistors; Package Size: 1210; JLCPCB Basic Part: Yes; Tolerance: ±5%; Voltage Rating: 200V; Temperature Coefficient: ±100ppm/℃; Temperature Rating: -55℃~+155℃; ComponentLink1Description: Datasheet; ComponentLink1URL: https://wmsc.lcsc.com/wmsc/upload/file/pdf/v2/lcsc/2308241115_FOJAN-FRC1210J112-TS_C2933831.pdf; ComponentLink2Description: JLCPCB Part URL; ComponentLink2URL: https://jlcpcb.com/partdetail/C2933831
pins: 1, 2
1 alternate drawing of the same symbol

## FRC1210J114 TS
designator R?  Resistance: 110kΩ  (hidden comment: *)
Resistor, 110kΩ, ±5%, 333.333mW, 200V, ±100ppm/℃, -55℃~+155℃, SMD 1210; Manufacturer: Uniroyal; Manufacturer Part Number: FRC1210J114 TS; Supplier 1: LCSC; Supplier Part Number 1: C2933832; JLCPCB Part Number: C2933832; Power Rating: 333.333mW; Category: Resistors; Package Size: 1210; JLCPCB Basic Part: Yes; Tolerance: ±5%; Voltage Rating: 200V; Temperature Coefficient: ±100ppm/℃; Temperature Rating: -55℃~+155℃; ComponentLink1Description: Datasheet; ComponentLink1URL: https://wmsc.lcsc.com/wmsc/upload/file/pdf/v2/lcsc/2308241115_FOJAN-FRC1210J114-TS_C2933832.pdf; ComponentLink2Description: JLCPCB Part URL; ComponentLink2URL: https://jlcpcb.com/partdetail/C2933832
pins: 1, 2
1 alternate drawing of the same symbol

## FRC1210J120TS
designator R?  Resistance: 12Ω  (hidden comment: *)
Resistor, 12Ω, ±5%, 333.333mW, 200V, ±100ppm/℃, -55℃~+155℃, SMD 1210; Manufacturer: Uniroyal; Manufacturer Part Number: FRC1210J120TS; Supplier 1: LCSC; Supplier Part Number 1: C2930438; JLCPCB Part Number: C2930438; Power Rating: 333.333mW; Category: Resistors; Package Size: 1210; JLCPCB Basic Part: Yes; Tolerance: ±5%; Voltage Rating: 200V; Temperature Coefficient: ±100ppm/℃; Temperature Rating: -55℃~+155℃; ComponentLink1Description: Datasheet; ComponentLink1URL: https://wmsc.lcsc.com/wmsc/upload/file/pdf/v2/lcsc/2308241947_FOJAN-FRC1210J120TS_C2930438.pdf; ComponentLink2Description: JLCPCB Part URL; ComponentLink2URL: https://jlcpcb.com/partdetail/C2930438
pins: 1, 2
1 alternate drawing of the same symbol
